# Altium footprint library CONNECTOR.PcbLib: 169 footprints (part 1 of 11)
Each footprint in its own frame and in the unit in brackets; x right, y up, seen from the top. Pads: shape width x height; smd on the part's side, far side on the other; paste and mask are expansions set on the pad; w line width, h text height; cw(c..) or ccw(c..) is an arc to the next point about the centre after c.
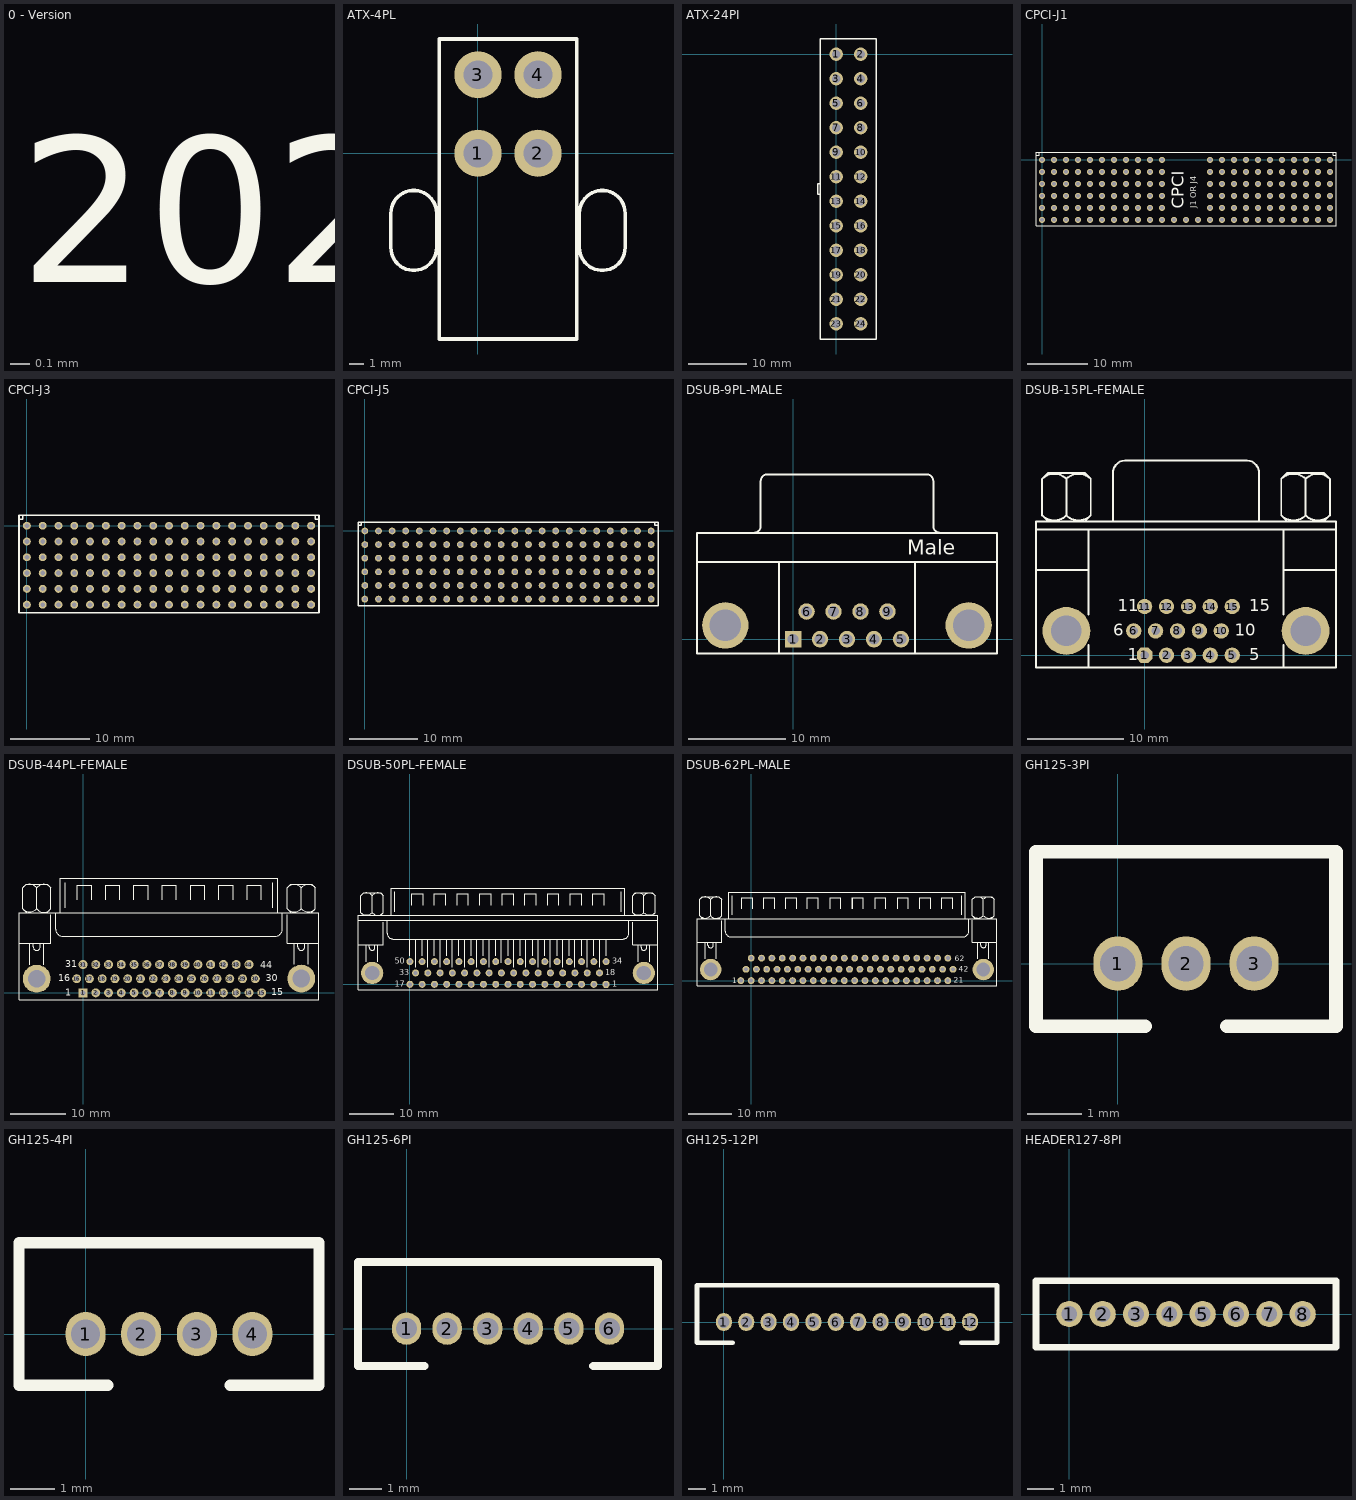
[diagram p0: the footprints below, top view; thin cyan lines are the x and y axes]

## 0 - Version [mm]
Top Overlay:
  text "Connector / v1.0.5 / 2020/04/12" at -1269.5,-1269.5 h1.52

## ATX-4PL [mm]
pads (4):
  round 3.3 hole 2: 1(0,0) 2(4.2,0) 3(0,5.5) 4(4.2,5.5)
Top Overlay:
  lines w0.25: -6.1,-6.6 ccw(c-4.5,-6.6) -2.9,-6.6 -2.9,-4.2 ccw(c-4.5,-4.2) -6.1,-4.2 -6.1,-6.6 ; -2.7,-13 6.9,-13 6.9,8 -2.7,8 -2.7,-13 ; 7.1,-6.6 ccw(c8.7,-6.6) 10.3,-6.6 10.3,-4.2 ccw(c8.7,-4.2) 7.1,-4.2 7.1,-6.6

## ATX-24PI [mm]
pads (24):
  round 2.3 hole 1.45: 1(0,0) 2(4.2,0) 3(0,-4.2) 4(4.2,-4.2) 5(0,-8.4) 6(4.2,-8.4) 7(0,-12.6) 8(4.2,-12.6) 9(0,-16.8) 10(4.2,-16.8) 11(0,-21) 12(4.2,-21) 13(0,-25.2) 14(4.2,-25.2) 15(0,-29.4) 16(4.2,-29.4) 17(0,-33.6) 18(4.2,-33.6) 19(0,-37.8) 20(4.2,-37.8) 21(0,-42) 22(4.2,-42) 23(0,-46.2) 24(4.2,-46.2)
Top Overlay:
  lines w0.254: -2.725,-24.025 -3.2,-24.025 -3.2,-22.175 -2.7,-22.175 ; -2.7,-48.8 -2.7,2.6 6.9,2.6 6.9,-48.8 -2.7,-48.8
3D body "1-1775099-3.stp": height 12, standoff -4, extent -4.055,-48.919 6.845,5.632

## CPCI-J1 [mm]
height 12.2
pads (135):
  round 1 hole 0.6: A1(0,0) A2(2,0) A3(4,0) A4(6,0) A5(8,0) A6(10,0) A7(12,0) A8(14,0) A9(16,0) A10(18,0) A11(20,0) A15(28,0) A16(30,0) A17(32,0) A18(34,0) A19(36,0) A20(38,0) A21(40,0) A22(42,0) A23(44,0) A24(46,0) A25(48,0) B1(0,-2) B2(2,-2) B3(4,-2) B4(6,-2) B5(8,-2) B6(10,-2) B7(12,-2) B8(14,-2) B9(16,-2) B10(18,-2) B11(20,-2) B15(28,-2) B16(30,-2) B17(32,-2) B18(34,-2) B19(36,-2) B20(38,-2) B21(40,-2) B22(42,-2) B23(44,-2) B24(46,-2) B25(48,-2) C1(0,-4) C2(2,-4) C3(4,-4) C4(6,-4) C5(8,-4) C6(10,-4) C7(12,-4) C8(14,-4) C9(16,-4) C10(18,-4) C11(20,-4) C15(28,-4) C16(30,-4) C17(32,-4) C18(34,-4) C19(36,-4) C20(38,-4) C21(40,-4) C22(42,-4) C23(44,-4) C24(46,-4) C25(48,-4) D1(0,-6) D2(2,-6) D3(4,-6) D4(6,-6) D5(8,-6) D6(10,-6) D7(12,-6) D8(14,-6) D9(16,-6) D10(18,-6) D11(20,-6) D15(28,-6) D16(30,-6) D17(32,-6) D18(34,-6) D19(36,-6) D20(38,-6) D21(40,-6) D22(42,-6) D23(44,-6) D24(46,-6) D25(48,-6) E1(0,-8) E2(2,-8) E3(4,-8) E4(6,-8) E5(8,-8) E6(10,-8) E7(12,-8) E8(14,-8) E9(16,-8) E10(18,-8) E11(20,-8) E15(28,-8) E16(30,-8) E17(32,-8) E18(34,-8) E19(36,-8) E20(38,-8) E21(40,-8) E22(42,-8) E23(44,-8) E24(46,-8) E25(48,-8) F1(0,-10) F2(2,-10) F3(4,-10) F4(6,-10) F5(8,-10) F6(10,-10) F7(12,-10) F8(14,-10) F9(16,-10) F10(18,-10) F11(20,-10) F12(22,-10) F13(24,-10) F14(26,-10) F15(28,-10) F16(30,-10) F17(32,-10) F18(34,-10) F19(36,-10) F20(38,-10) F21(40,-10) F22(42,-10) F23(44,-10) F24(46,-10) F25(48,-10)
Top Overlay:
  lines w0.2: -1,0.8 -0.5,0.8 -0.5,1.3 ; 48.5,1.3 48.5,0.8 49,0.8 ; -1,-11 49,-11 49,1.3 -1,1.3 -1,-11
  text "CPCI" at 23.65,-8.15 h2
  text "J1 OR J4" at 25.71,-8.04 h1

## CPCI-J3 [mm]
height 12.2
pads (114):
  round 1 hole 0.6: A1(0,0) A2(2,0) A3(4,0) A4(6,0) A5(8,0) A6(10,0) A7(12,0) A8(14,0) A9(16,0) A10(18,0) A11(20,0) A12(22,0) A13(24,0) A14(26,0) A15(28,0) A16(30,0) A17(32,0) A18(34,0) A19(36,0) B2(0,-2) B3(2,-2) B4(4,-2) B5(6,-2) B6(8,-2) B7(10,-2) B8(12,-2) B9(14,-2) B10(16,-2) B11(18,-2) B12(20,-2) B13(22,-2) B14(24,-2) B15(26,-2) B16(28,-2) B17(30,-2) B18(32,-2) B19(34,-2) B20(36,-2) C1(0,-4) C2(2,-4) C3(4,-4) C4(6,-4) C5(8,-4) C6(10,-4) C7(12,-4) C8(14,-4) C9(16,-4) C10(18,-4) C11(20,-4) C12(22,-4) C13(24,-4) C14(26,-4) C15(28,-4) C16(30,-4) C17(32,-4) C18(34,-4) C19(36,-4) D1(0,-6) D2(2,-6) D3(4,-6) D4(6,-6) D5(8,-6) D6(10,-6) D7(12,-6) D8(14,-6) D9(16,-6) D10(18,-6) D11(20,-6) D12(22,-6) D13(24,-6) D14(26,-6) D15(28,-6) D16(30,-6) D17(32,-6) D18(34,-6) D19(36,-6) E1(0,-8) E2(2,-8) E3(4,-8) E4(6,-8) E5(8,-8) E6(10,-8) E7(12,-8) E8(14,-8) E9(16,-8) E10(18,-8) E11(20,-8) E12(22,-8) E13(24,-8) E14(26,-8) E15(28,-8) E16(30,-8) E17(32,-8) E18(34,-8) E19(36,-8) F1(0,-10) F2(2,-10) F3(4,-10) F4(6,-10) F5(8,-10) F6(10,-10) F7(12,-10) F8(14,-10) F9(16,-10) F10(18,-10) F11(20,-10) F12(22,-10) F13(24,-10) F14(26,-10) F15(28,-10) F16(30,-10) F17(32,-10) F18(34,-10) F19(36,-10)
Top Overlay:
  lines w0.2: -1,0.8 -0.5,0.8 -0.5,1.3 ; 36.5,1.3 36.5,0.8 37,0.8 ; -1,-11 37,-11 37,1.3 -1,1.3 -1,-11

## CPCI-J5 [mm]
height 12.2
pads (132):
  round 1 hole 0.6: A1(0,0) A2(2,0) A3(4,0) A4(6,0) A5(8,0) A6(10,0) A7(12,0) A8(14,0) A9(16,0) A10(18,0) A11(20,0) A12(22,0) A13(24,0) A14(26,0) A15(28,0) A16(30,0) A17(32,0) A18(34,0) A19(36,0) A20(38,0) A21(40,0) A22(42,0) B2(0,-2) B3(2,-2) B4(4,-2) B5(6,-2) B6(8,-2) B7(10,-2) B8(12,-2) B9(14,-2) B10(16,-2) B11(18,-2) B12(20,-2) B13(22,-2) B14(24,-2) B15(26,-2) B16(28,-2) B17(30,-2) B18(32,-2) B19(34,-2) B20(36,-2) B21(38,-2) B22(40,-2) B23(42,-2) C1(0,-4) C2(2,-4) C3(4,-4) C4(6,-4) C5(8,-4) C6(10,-4) C7(12,-4) C8(14,-4) C9(16,-4) C10(18,-4) C11(20,-4) C12(22,-4) C13(24,-4) C14(26,-4) C15(28,-4) C16(30,-4) C17(32,-4) C18(34,-4) C19(36,-4) C20(38,-4) C21(40,-4) C22(42,-4) D1(0,-6) D2(2,-6) D3(4,-6) D4(6,-6) D5(8,-6) D6(10,-6) D7(12,-6) D8(14,-6) D9(16,-6) D10(18,-6) D11(20,-6) D12(22,-6) D13(24,-6) D14(26,-6) D15(28,-6) D16(30,-6) D17(32,-6) D18(34,-6) D19(36,-6) D20(38,-6) D21(40,-6) D22(42,-6) E1(0,-8) E2(2,-8) E3(4,-8) E4(6,-8) E5(8,-8) E6(10,-8) E7(12,-8) E8(14,-8) E9(16,-8) E10(18,-8) E11(20,-8) E12(22,-8) E13(24,-8) E14(26,-8) E15(28,-8) E16(30,-8) E17(32,-8) E18(34,-8) E19(36,-8) E20(38,-8) E21(40,-8) E22(42,-8) F1(0,-10) F2(2,-10) F3(4,-10) F4(6,-10) F5(8,-10) F6(10,-10) F7(12,-10) F8(14,-10) F9(16,-10) F10(18,-10) F11(20,-10) F12(22,-10) F13(24,-10) F14(26,-10) F15(28,-10) F16(30,-10) F17(32,-10) F18(34,-10) F19(36,-10) F20(38,-10) F21(40,-10) F22(42,-10)
Top Overlay:
  lines w0.2: -1,0.8 -0.5,0.8 -0.5,1.3 ; 42.49,1.3 42.49,0.8 42.99,0.8 ; -1,-11 -1,1.3 43,1.3 43,-11 -1,-11

## DSUB-9PL-MALE [mm]
height 10
pads (11):
  rect 1.69x1.69 hole 1.09: 1(0,0)
  round 1.69 hole 1.09: 2(2.77,0) 3(5.54,0) 4(8.31,0) 5(11.08,0) 6(1.385,2.84) 7(4.155,2.84) 8(6.925,2.84) 9(9.695,2.84)
  round 4.76 hole 3.26: ""(-6.955,1.42) ""(18.035,1.42)
Top Overlay:
  lines w0.2: -9.86,7.92 20.94,7.92 ; -4.02,10.925 ccw(c-4.02,11.62) -3.325,11.62 -3.325,16.22 ; -3.32,16.225 cw(c-2.625,16.225) -2.625,16.92 13.705,16.92 cw(c13.705,16.225) 14.4,16.225 ; -1.46,-1.48 -1.46,7.92 ; 12.54,-1.48 12.54,7.92 ; 14.405,16.22 14.405,11.62 ccw(c15.1,11.62) 15.1,10.925 ; -9.86,-1.48 -9.86,10.92 20.94,10.92 20.94,-1.48 -9.86,-1.48
  text "Male" at 11.741,8.647 h1.52
3D body "User Library-CON-233.STEP": height 12.77, standoff -3.65, extent -9.861,-1.566 20.939,16.834

## DSUB-15PL-FEMALE [mm]
pads (17):
  oct 1.6x1.6 hole 0.9: 1(-0.001,-0.001)
  round 1.6 hole 0.9: 2(2.285,-0.001) 3(4.571,-0.001) 4(6.857,-0.001) 5(9.143,-0.001) 6(-1.144,2.539) 7(1.142,2.539) 8(3.428,2.539) 9(5.714,2.539) 10(8,2.539) 11(-0.001,5.079) 12(2.285,5.079) 13(4.571,5.079) 14(6.857,5.079) 15(9.143,5.079)
  round 4.995 hole 3.2: ""(-8.171,2.539) ""(16.805,2.539)
Top Overlay:
  lines w0.203: -11.346,8.889 -5.843,8.889 ; -11.346,13.123 19.98,13.123 ; -10.713,14.602 ccw(c-9.441,15.874) -8.169,14.602 ; -10.713,18.417 cw(c-9.441,17.144) -8.169,18.417 ; -10.076,13.969 -10.711,14.604 -10.711,18.414 -10.076,19.049 -6.266,19.049 -5.631,18.414 -5.631,14.604 -6.266,13.969 ; -8.173,14.602 ccw(c-6.901,15.874) -5.629,14.602 ; -8.173,18.417 cw(c-6.901,17.144) -5.629,18.417 ; -8.171,14.604 -8.171,18.414 ; -5.843,-1.271 -5.843,1.058 ; -5.843,4.233 -5.843,8.889 ; -5.843,13.123 -5.843,8.889 ; -3.303,13.969 -3.303,19.049 cw(c-2.033,19.049) -2.033,20.319 10.667,20.319 cw(c10.667,19.049) 11.937,19.049 11.937,13.969 ; 14.263,14.602 ccw(c15.535,15.874) 16.808,14.602 ; 14.263,18.417 cw(c15.535,17.144) 16.808,18.417 ; 14.477,-1.271 14.477,1.058 ; 14.477,4.233 14.477,8.889 ; 14.477,13.123 14.477,8.889 ; 14.9,13.969 14.265,14.604 14.265,18.414 14.9,19.049 18.71,19.049 19.345,18.414 19.345,14.604 18.71,13.969 ; 16.803,14.602 ccw(c18.075,15.874) 19.348,14.602 ; 16.803,18.417 cw(c18.075,17.144) 19.348,18.417 ; 16.805,14.604 16.805,18.414 ; 19.98,8.889 14.477,8.889 ; -11.346,-1.271 -11.346,13.969 19.98,13.969 19.98,-1.271 -11.346,-1.271
  text "5" at 10.921,-0.509 h1.27
  text "10" at 9.397,2.031 h1.27
  text "15" at 10.921,4.571 h1.27
  text "11" at -2.795,4.571 h1.27
  text "6" at -3.303,2.031 h1.27
  text "1" at -1.779,-0.509 h1.27
3D body "70471.stp": height 12.27, standoff -4.9, extent -11.124,-2.118 19.716,19.782

## DSUB-44PL-FEMALE [mm]
pads (46):
  rect 1.6x1.6 hole 0.9: 1(0,0)
  round 1.6 hole 0.9: 2(2.29,0) 3(4.58,0) 4(6.87,0) 5(9.16,0) 6(11.45,0) 7(13.74,0) 8(16.03,0) 9(18.32,0) 10(20.61,0) 11(22.9,0) 12(25.19,0) 13(27.48,0) 14(29.77,0) 15(32.06,0) 16(-1.145,2.54) 17(1.145,2.54) 18(3.435,2.54) 19(5.725,2.54) 20(8.015,2.54) 21(10.305,2.54) 22(12.595,2.54) 23(14.885,2.54) 24(17.175,2.54) 25(19.465,2.54) 26(21.755,2.54) 27(24.045,2.54) 28(26.335,2.54) 29(28.625,2.54) 30(30.915,2.54) 31(0,5.08) 32(2.29,5.08) 33(4.58,5.08) 34(6.87,5.08) 35(9.16,5.08) 36(11.45,5.08) 37(13.74,5.08) 38(16.03,5.08) 39(18.32,5.08) 40(20.61,5.08) 41(22.9,5.08) 42(25.19,5.08) 43(27.48,5.08) 44(29.77,5.08)
  round 4.995 hole 3.2: ""(-8.315,2.54) ""(39.163,2.55)
Top Overlay:
  lines w0.203: -11.49,8.89 -5.775,8.89 -5.775,13.97 ; -11.49,14.393 42.336,14.375 ; -11.482,14.395 -11.49,-1.27 42.336,-1.275 ; -10.857,15.059 ccw(c-9.585,16.332) -8.313,15.059 ; -10.85,18.875 cw(c-9.585,17.813) -8.321,18.875 ; -10.22,14.427 -10.855,15.062 -10.855,18.872 -10.22,19.507 -6.41,19.507 -5.775,18.872 -5.775,15.062 -6.41,14.427 ; -9.585,5.08 -9.585,8.89 ; -8.95,8.89 -8.95,8.255 ccw(c-8.315,8.255) -7.68,8.255 -7.68,8.89 ; -8.315,15.062 -8.315,18.872 ; -8.31,15.059 ccw(c-7.045,16.12) -5.781,15.059 ; -8.31,18.875 cw(c-7.045,17.813) -5.781,18.875 ; -7.045,5.08 -7.045,8.89 ; -4.929,14.393 -4.929,11.43 ccw(c-3.659,11.43) -3.659,10.16 34.586,10.175 ; -4.082,14.427 -4.082,20.565 34.911,20.6 ; -3.235,15.273 -3.235,19.718 ; -1.017,16.73 -1.017,19.27 1.523,19.27 1.523,16.73 ; 4.063,16.73 4.063,19.27 6.603,19.27 6.603,16.73 ; 9.143,16.73 9.143,19.27 11.683,19.27 11.683,16.73 ; 14.223,16.73 14.223,19.27 16.763,19.27 16.763,16.73 ; 19.303,16.73 19.303,19.27 21.843,19.27 21.843,16.73 ; 24.383,16.73 24.383,19.27 26.923,19.27 26.923,16.73 ; 29.463,16.73 29.463,19.27 32.003,19.27 32.003,16.73 ; 34.083,15.283 34.083,19.728 ; 34.506,10.17 ccw(c34.506,11.44) 35.776,11.44 35.776,14.403 ; 34.93,14.437 34.93,20.575 ; 36.621,15.069 ccw(c37.893,16.342) 39.165,15.069 ; 36.621,18.884 cw(c37.893,17.612) 39.165,18.884 ; 36.623,13.98 36.623,8.9 42.338,8.9 ; 37.258,14.437 37.046,14.648 36.623,15.072 36.623,18.882 37.258,19.517 41.068,19.517 41.703,18.882 41.703,15.072 41.068,14.437 ; 37.893,5.09 37.893,8.9 ; 38.528,8.9 38.528,8.265 ccw(c39.163,8.265) 39.798,8.265 39.798,8.9 ; 39.161,15.069 ccw(c40.433,16.342) 41.705,15.069 ; 39.161,18.884 cw(c40.433,17.612) 41.705,18.884 ; 39.163,15.072 39.163,18.882 ; 40.433,5.09 40.433,8.9 ; 42.338,-1.26 42.338,14.38
  text "30" at 32.811,2.05 h1.27
  text "31" at -3.235,4.572 h1.27
  text "16" at -4.489,2.05 h1.27
  text "15" at 33.786,-0.45 h1.27
  text "44" at 31.811,4.45 h1.27
  text "1" at -3.235,-0.508 h1.27
3D body "70475.stp": height 12.27, standoff -4.9, extent -11.044,-2.137 42.006,19.763

## DSUB-50PL-FEMALE [mil]
pads (52):
  oct 62x62 hole 35: 1(1733.34,0)
  round 62 hole 35: 2(1625.01,0) 3(1516.68,0) 4(1408.34,0) 5(1300.01,0) 6(1191.68,0) 7(1083.34,0) 8(975.01,0) 9(866.68,0) 10(758.34,0) 11(650.01,0) 12(541.68,0) 13(433.34,0) 14(325.01,0) 15(216.68,0) 16(108.34,0) 17(0.01,0) 18(1675.01,100) 19(1566.68,100) 20(1458.34,100) 21(1350.01,100) 22(1241.68,100) 23(1133.34,100) 24(1025.01,100) 25(916.68,100) 26(808.34,100) 27(700.01,100) 28(591.68,100) 29(483.34,100) 30(375.01,100) 31(266.68,100) 32(158.34,100) 33(50.01,100) 34(1733.34,200) 35(1625.01,200) 36(1516.68,200) 37(1408.34,200) 38(1300.01,200) 39(1191.68,200) 40(1083.34,200) 41(975.01,200) 42(866.68,200) 43(758.34,200) 44(650.01,200) 45(541.68,200) 46(433.34,200) 47(325.01,200) 48(216.68,200) 49(108.34,200) 50(0.01,200)
  round 196.67 hole 125.98: ""(-333.32,100) ""(2066.68,100)
Top Overlay:
  lines w8: -458.32,350 -233.32,350 -233.32,550 ; -458.32,566.67 2191.68,566.67 ; -433.41,633.25 ccw(c-383.32,683.33) -333.24,633.25 ; -433.12,783.45 cw(c-383.32,741.67) -333.53,783.45 ; -408.32,608.33 -433.32,633.33 -433.32,783.33 -408.32,808.33 -258.32,808.33 -233.32,783.33 -233.32,633.33 -258.32,608.33 ; -383.32,200 -383.32,350 ; -358.32,350 -358.32,325 ccw(c-333.32,325) -308.32,325 -308.32,350 ; -333.32,633.33 -333.32,783.33 ; -333.12,633.22 ccw(c-283.32,675) -233.53,633.22 ; -333.12,783.45 cw(c-283.32,741.67) -233.53,783.45 ; -283.32,200 -283.32,350 ; -199.99,566.67 -199.99,450 ccw(c-149.99,450) -149.99,400 1883.34,400 ccw(c1883.34,450) 1933.34,450 1933.34,566.67 ; -166.66,608.33 -166.66,850 1900.01,850 1900.01,608.33 ; -133.32,641.67 -133.32,816.67 ; 0.01,250 0.01,400 ; 16.68,700 16.68,800 116.68,800 116.68,700 ; 50.01,150 50.01,400 ; 108.34,250 108.34,400 ; 158.34,150 158.34,400 ; 216.68,250 216.68,400 ; 216.68,700 216.68,800 316.68,800 316.68,700 ; 266.68,150 266.68,400 ; 325.01,250 325.01,400 ; 375.01,150 375.01,400 ; 416.68,700 416.68,800 516.68,800 516.68,700 ; 433.34,250 433.34,400 ; 483.34,150 483.34,400 ; 541.68,250 541.68,400 ; 591.68,150 591.68,400 ; 616.68,700 616.68,800 716.68,800 716.68,700 ; 650.01,250 650.01,400 ; 700.01,150 700.01,400 ; 758.34,250 758.34,400 ; 808.34,191.67 808.34,400 ; 816.68,700 816.68,800 916.68,800 916.68,700 ; 866.68,250 866.68,400 ; 916.68,150 916.68,400 ; 975.01,250 975.01,400 ; 1016.68,700 1016.68,800 1116.68,800 1116.68,700 ; 1025.01,150 1025.01,400 ; 1083.34,250 1083.34,400 ; 1133.34,150 1133.34,400 ; 1191.68,250 1191.68,400 ; 1216.68,700 1216.68,800 1316.68,800 1316.68,700 ; 1241.68,150 1241.68,400 ; 1300.01,250 1300.01,400 ; 1350.01,150 1350.01,400 ; 1408.34,250 1408.34,400 ; 1416.68,700 1416.68,800 1516.68,800 1516.68,700 ; 1458.34,150 1458.34,400 ; 1516.68,250 1516.68,400 ; 1566.68,150 1566.68,400 ; 1616.68,700 1616.68,800 1716.68,800 1716.68,700 ; 1625.01,250 1625.01,400 ; 1675.01,150 1675.01,400 ; 1733.34,250 1733.34,400 ; 1866.68,641.67 1866.68,816.67 ; 1966.59,633.25 ccw(c2016.68,683.33) 2066.76,633.25 ; 1966.59,783.42 cw(c2016.68,733.33) 2066.76,783.42 ; 1966.68,550 1966.68,350 2191.68,350 ; 1991.68,608.33 1983.34,616.67 1966.68,633.33 1966.68,783.33 1991.68,808.33 2141.68,808.33 2166.68,783.33 2166.68,633.33 2141.68,608.33 ; 2016.68,200 2016.68,350 ; 2041.68,350 2041.68,325 ccw(c2066.68,325) 2091.68,325 2091.68,350 ; 2066.59,633.25 ccw(c2116.68,683.33) 2166.76,633.25 ; 2066.59,783.42 cw(c2116.68,733.33) 2166.76,783.42 ; 2066.68,633.33 2066.68,783.33 ; 2116.68,200 2116.68,350 ; -458.32,-50 2191.68,-50 2191.68,608.33 -458.32,608.33 -458.32,-50
  text "34" at 1786.68,180 h50
  text "18" at 1726.68,80 h50
  text "1" at 1786.68,-20 h50
  text "17" at -133.32,-20 h50
  text "33" at -93.32,80 h50
  text "50" at -133.32,180 h50
3D body "User Library-50-pin_Dsub_Female.step": height 645.67, standoff -125.98, extent -453.28,-79.06 2184.51,851.65

## DSUB-62PL-MALE [mm]
pads (64):
  round 1.6 hole 0.9: 1(-2.45,0) 2(-0.04,0) 3(2.37,0) 4(4.78,0) 5(7.19,0) 6(9.6,0) 7(12.01,0) 8(14.42,0) 9(16.83,0) 10(19.24,0) 11(21.65,0) 12(24.06,0) 13(26.47,0) 14(28.88,0) 15(31.29,0) 16(33.7,0) 17(36.11,0) 18(38.52,0) 19(40.93,0) 20(43.35,0) 21(45.75,0) 22(-1.243,2.639) 23(1.167,2.639) 24(3.577,2.639) 25(5.987,2.639) 26(8.397,2.639) 27(10.807,2.639) 28(13.217,2.639) 29(15.627,2.639) 30(18.037,2.639) 31(20.447,2.639) 32(22.857,2.639) 33(25.267,2.639) 34(27.677,2.639) 35(30.087,2.639) 36(32.497,2.639) 37(34.907,2.639) 38(37.317,2.639) 39(39.727,2.639) 40(42.137,2.639) 41(44.557,2.639) 42(46.957,2.639) 43(-0.032,5.222) 44(2.378,5.222) 45(4.788,5.222) 46(7.198,5.222) 47(9.608,5.222) 48(12.018,5.222) 49(14.428,5.222) 50(16.838,5.222) 51(19.248,5.222) 52(21.658,5.222) 53(24.068,5.222) 54(26.478,5.222) 55(28.888,5.222) 56(31.298,5.222) 57(33.708,5.222) 58(36.118,5.222) 59(38.528,5.222) 60(40.938,5.222) 61(43.358,5.222) 62(45.758,5.222)
  round 4.995 hole 3.2: ""(-9.48,2.565) ""(54.02,2.565)
Top Overlay:
  lines w0.203: -12.655,8.915 -6.94,8.915 -6.94,13.995 ; -12.655,14.419 57.207,14.419 ; -12.647,14.42 -12.655,-1.245 57.207,-1.25 ; -12.023,15.085 ccw(c-10.75,16.357) -9.478,15.085 ; -12.015,18.9 cw(c-10.75,17.839) -9.486,18.9 ; -11.385,14.452 -12.02,15.087 -12.02,18.897 -11.385,19.532 -7.575,19.532 -6.94,18.897 -6.94,15.087 -7.575,14.452 ; -10.75,5.105 -10.75,8.915 ; -10.115,8.915 -10.115,8.28 ccw(c-9.48,8.28) -8.845,8.28 -8.845,8.915 ; -9.48,15.087 -9.48,18.897 ; -9.475,15.084 ccw(c-8.21,16.145) -6.946,15.084 ; -9.475,18.9 cw(c-8.21,17.839) -6.946,18.9 ; -8.21,5.105 -8.21,8.915 ; -6.094,14.419 -6.094,11.455 ccw(c-4.824,11.455) -4.824,10.185 49.335,10.2 ; -5.247,14.452 -5.247,20.59 49.799,20.625 ; -4.4,15.299 -4.4,19.744 ; -2.182,16.755 -2.182,19.295 0.358,19.295 0.358,16.755 ; 2.898,16.755 2.898,19.295 5.438,19.295 5.438,16.755 ; 7.978,16.755 7.978,19.295 10.518,19.295 10.518,16.755 ; 13.047,16.755 13.047,19.295 15.587,19.295 15.587,16.755 ; 13.058,16.755 13.058,19.295 15.598,19.295 15.598,16.755 ; 18.327,16.755 18.327,19.295 20.867,19.295 20.867,16.755 ; 23.547,16.755 23.547,19.295 26.087,19.295 26.087,16.755 ; 23.557,16.755 23.557,19.295 26.097,19.295 26.097,16.755 ; 28.802,16.755 28.802,19.295 31.342,19.295 31.342,16.755 ; 34.047,16.755 34.047,19.295 36.587,19.295 36.587,16.755 ; 39.252,16.755 39.252,19.295 41.792,19.295 41.792,16.755 ; 44.332,16.755 44.332,19.295 46.872,19.295 46.872,16.755 ; 48.952,15.309 48.952,19.754 ; 49.376,10.195 ccw(c49.376,11.465) 50.646,11.465 50.646,14.429 ; 49.799,14.462 49.799,20.6 ; 51.49,15.095 ccw(c52.762,16.367) 54.035,15.095 ; 51.49,18.909 cw(c52.762,17.637) 54.035,18.909 ; 51.492,14.005 51.492,8.925 57.207,8.925 ; 52.127,14.462 51.916,14.674 51.492,15.097 51.492,18.907 52.127,19.542 55.937,19.542 56.572,18.907 56.572,15.097 55.937,14.462 ; 52.762,5.115 52.762,8.925 ; 53.397,8.925 53.397,8.29 ccw(c54.032,8.29) 54.667,8.29 54.667,8.925 ; 54.03,15.095 ccw(c55.302,16.367) 56.575,15.095 ; 54.03,18.909 cw(c55.302,17.637) 56.575,18.909 ; 54.032,15.097 54.032,18.907 ; 55.302,5.115 55.302,8.925 ; 57.207,-1.235 57.207,14.405
  text "1" at -4.407,-0.585 h1.27
  text "62" at 47.373,4.56 h1.27
  text "21" at 47.132,-0.537 h1.27
  text "42" at 48.298,2.107 h1.27
3D body "10090926p624xlf.stp": height 12.55, standoff -4, extent -12.563,-1.991 57.037,19.709

## GH125-3PI [mm]
pads (3):
  oval 0.9x1 hole 0.65: 1(0,-0.001) 2(1.25,-0.001) 3(2.5,-0.001)
Top Overlay:
  lines w0.254: 0.5,-1.151 -1.5,-1.151 -1.5,2.049 4,2.049 4,-1.151 2,-1.151

## GH125-4PI [mm]
pads (4):
  oval 0.9x1 hole 0.65: 1(0,0) 2(1.25,0) 3(2.5,0) 4(3.75,0)
Top Overlay:
  lines w0.254: 0.5,-1.15 -1.5,-1.15 -1.5,2.05 5.23,2.05 ; 3.25,-1.15 5.25,-1.15 5.25,2.05

## GH125-6PI [mm]
pads (6):
  oval 0.9x1 hole 0.65: 1(0,0) 2(1.25,0) 3(2.5,0) 4(3.75,0) 5(5,0) 6(6.25,0)
Top Overlay:
  lines w0.254: 0.55,-1.15 -1.5,-1.15 -1.5,2.05 7.75,2.05 7.75,-1.15 5.75,-1.15

## GH125-12PI [mm]
pads (12):
  oval 0.9x1 hole 0.65: 1(0,0) 2(1.25,0) 3(2.5,0) 4(3.75,0) 5(5,0) 6(6.25,0) 7(7.5,0) 8(8.75,0) 9(10,0) 10(11.25,0) 11(12.5,0) 12(13.75,0)
Top Overlay:
  lines w0.254: 0.5,-1.15 -1.5,-1.15 -1.5,2.05 15.25,2.05 15.25,-1.15 13.25,-1.15

## HEADER127-8PI [mm]
pads (8):
  round 1 hole 0.6: 1(0,0) 2(1.27,0) 3(2.54,0) 4(3.81,0) 5(5.08,0) 6(6.35,0) 7(7.62,0) 8(8.89,0)
Top Overlay:
  lines w0.25: -1.27,-1.27 -1.27,1.27 10.16,1.27 10.16,-1.27 -1.27,-1.27